# Altium footprint library PBL - THD Packages.PcbLib: 256 footprints (part 14 of 16)
Each footprint in its own frame and in the unit in brackets; x right, y up, seen from the top. Pads: shape width x height; smd on the part's side, far side on the other; paste and mask are expansions set on the pad; w line width, h text height; cw(c..) or ccw(c..) is an arc to the next point about the centre after c.
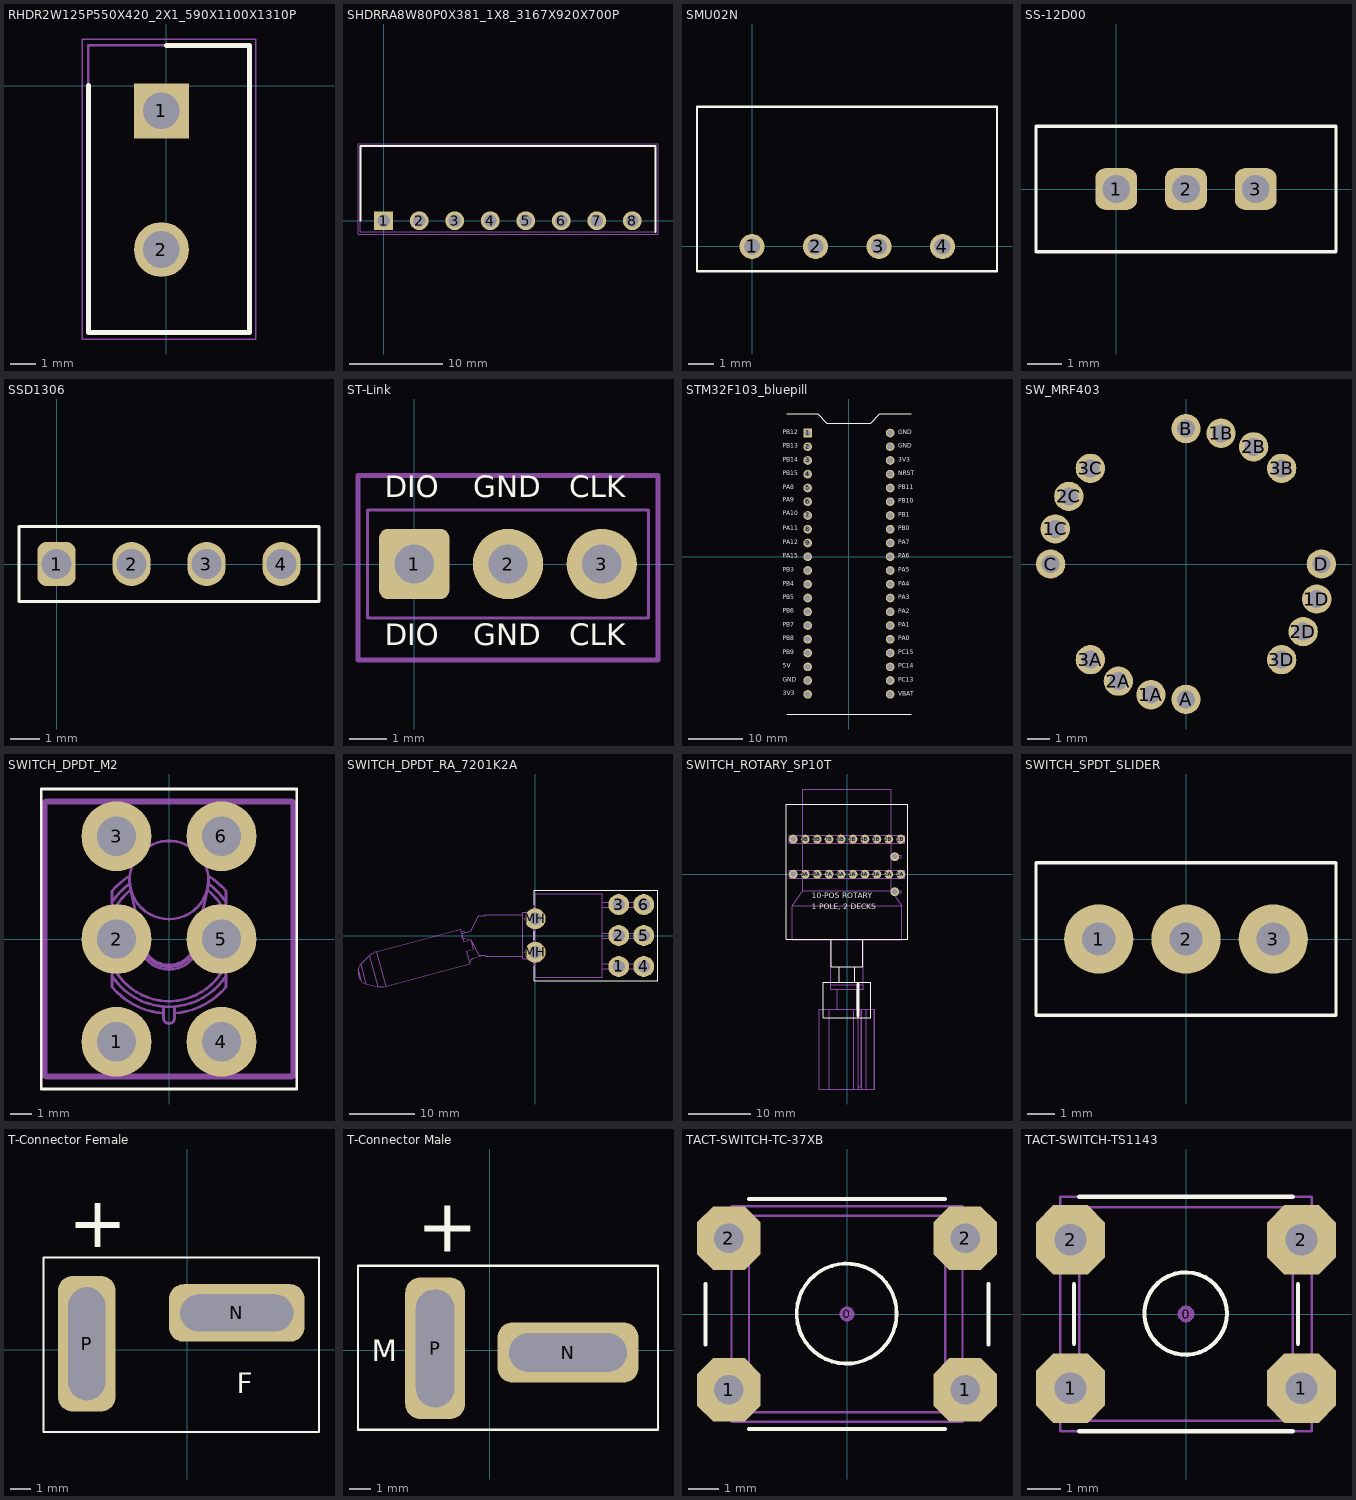
[diagram p13: the footprints below, top view; thin cyan lines are the x and y axes]

## RHDR2W125P550X420_2X1_590X1100X1310P [mm]
pads (2):
  rect 2.175x2.175 hole 1.45: 1(-0.2,-1)
  round 2.175 hole 1.45: 2(-0.2,-6.5)
Top Overlay:
  lines w0.2: -3.1,0 -3.1,-9.8 3.3,-9.8 3.3,1.6 0,1.6
13 - 3D Top Side:
  lines w0.1: -3.1,-9.8 3.3,-9.8 3.3,1.6 -3.1,1.6 -3.1,-9.8
15 - Top Courtyards:
  lines w0.05: -3.35,-10.05 3.55,-10.05 3.55,1.85 -3.35,1.85 -3.35,-10.05
3D body "39-28-1023.stp": height 12.8, standoff -3.5, extent -3.3,-9.8 2.9,1.2

## SHDRRA8W80P0X381_1X8_3167X920X700P [mm]
pads (8):
  rect 2.025x2.025 hole 1.35: 1(0,0)
  round 2.025 hole 1.35: 2(3.81,0) 3(7.62,0) 4(11.43,0) 5(15.24,0) 6(19.05,0) 7(22.86,0) 8(26.67,0)
Top Overlay:
  lines w0.2: -2.5,0 -2.5,8 29.17,8 29.17,-1.2
13 - 3D Top Side:
  lines w0.1: -2.5,-1.2 -2.5,8 29.17,8 29.17,-1.2 -2.5,-1.2
15 - Top Courtyards:
  lines w0.05: -2.75,-1.45 29.42,-1.45 29.42,8.25 -2.75,8.25 -2.75,-1.45
3D body "70054546.stp": height 7.35, standoff -3.3, extent -2.585,-1.25 29.285,8.05

## SMU02N [mm] "SMU02N series footprint"
pads (4):
  round 1 hole 0.65: 1(0,0) 2(2.54,0) 3(5.08,0) 4(7.62,0)
Top Overlay:
  lines w0.1: -2.2,-1 -2.2,5.6 9.8,5.6 9.8,-1 -2.2,-1

## SS-12D00 [mm]
pads (3):
  rrect50% 1.2x1.2 hole 0.8: 1(0,0) 2(2,0) 3(4,0)
Top Overlay:
  lines w0.1: -2.3,-1.8 6.3,-1.8 6.3,1.8 -2.3,1.8 -2.3,-1.8

## SSD1306 [mm] "OLED display"
pads (4):
  rrect50% 1.3x1.5 hole 1 mask+0.05: 1(0,0)
  oval 1.3x1.5 hole 1 mask+0.05: 2(2.54,0) 3(5.08,0) 4(7.62,0)
Top Overlay:
  lines w0.1: -1.27,-1.27 8.89,-1.27 8.89,1.27 -1.27,1.27 -1.27,-1.27
3D body "OLED.STEP": height 15.76, standoff -14.06, extent -15.864,-3.496 22.692,33.679

## ST-Link [mil] "Connector; Header; 3 Position"
pads (3):
  rrect25% 75x75 hole 42: 1(0,0)
  round 75 hole 42: 2(100,0) 3(200,0)
Top Overlay:
  text "CLK" at 165.35,62.99 h39.37
  text "DIO" at -31.5,62.99 h39.37
  text "GND" at 62.99,62.99 h39.37
  text "GND" at 62.99,-94.49 h39.37
  text "DIO" at -31.5,-94.49 h39.37
  text "CLK" at 165.35,-94.49 h39.37
13 - 3D Top Side:
  lines w3: -50,-57.47 250,-57.47 250,57.49 -50,57.49 -50,-57.47
15 - Top Courtyards:
  lines w5: -60,-102.36 260,-102.36 260,94.49 -60,94.49 -60,-102.36
3D body "PinHeaderX3.stp": height 335.04, standoff -144.88, extent -50,-57.47 250,57.49

## STM32F103_bluepill [mm]
pads (40):
  rect 1.6x1.6 hole 1.1: 1(-7.62,22.86)
  round 1.6 hole 1.1: 2(-7.62,20.32) 3(-7.62,17.78) 4(-7.62,15.24) 5(-7.62,12.7) 6(-7.62,10.16) 7(-7.62,7.62) 8(-7.62,5.08) 9(-7.62,2.54) 10(-7.62,0) 11(-7.62,-2.54) 12(-7.62,-5.08) 13(-7.62,-7.62) 14(-7.62,-10.16) 15(-7.62,-12.7) 16(-7.62,-15.24) 17(-7.62,-17.78) 18(-7.62,-20.32) 19(-7.62,-22.86) 20(-7.62,-25.4) 21(7.62,-25.4) 22(7.62,-22.86) 23(7.62,-20.32) 24(7.62,-17.78) 25(7.62,-15.24) 26(7.62,-12.7) 27(7.62,-10.16) 28(7.62,-7.62) 29(7.62,-5.08) 30(7.62,-2.54) 31(7.62,0) 32(7.62,2.54) 33(7.62,5.08) 34(7.62,7.62) 35(7.62,10.16) 36(7.62,12.7) 37(7.62,15.24) 38(7.62,17.78) 39(7.62,20.32) 40(7.62,22.86)
Top Overlay:
  lines w0.2: -11.52,-29.04 11.48,-29.04 ; -11.52,26.36 -5.77,26.36 -4.07,24.66 4.03,24.66 5.73,26.36 11.48,26.36
  text "PC15" at 9.144,-18.257 h1.4
  text "PC14" at 9.144,-20.797 h1.4
  text "PC13" at 9.145,-23.352 h1.4
  text "VBAT" at 9.145,-25.908 h1.4
  text "3V3" at -12.192,-25.892 h1.4
  text "GND" at -12.192,-23.352 h1.4
  text "5V" at -12.192,-20.812 h1.4
  text "PB9" at -12.192,-18.272 h1.4
  text "PB8" at -12.192,-15.732 h1.4
  text "PB7" at -12.192,-13.208 h1.4
  text "PB6" at -12.192,-10.652 h1.4
  text "PB5" at -12.192,-8.112 h1.4
  text "PB4" at -12.192,-5.588 h1.4
  text "PB3" at -12.192,-3.032 h1.4
  text "PA15" at -12.192,-0.492 h1.4
  text "PA12" at -12.192,2.032 h1.4
  text "PA11" at -12.192,4.572 h1.4
  text "PA10" at -12.192,7.382 h1.4
  text "PA9" at -12.192,9.922 h1.4
  text "PA8" at -12.192,12.208 h1.4
  text "PB15" at -12.192,14.748 h1.4
  text "PB14" at -12.192,17.272 h1.4
  text "PB13" at -12.192,19.828 h1.4
  text "PB12" at -12.192,22.352 h1.4
  text "PA0" at 9.145,-15.732 h1.4
  text "PA1" at 9.144,-13.208 h1.4
  text "PA2" at 9.144,-10.668 h1.4
  text "PA3" at 9.144,-8.112 h1.4
  text "PA4" at 9.144,-5.588 h1.4
  text "PA5" at 9.144,-3.032 h1.4
  text "PA6" at 9.144,-0.492 h1.4
  text "PA7" at 9.144,2.032 h1.4
  text "PB0" at 9.144,4.588 h1.4
  text "PB1" at 9.144,7.112 h1.4
  text "PB10" at 9.144,9.668 h1.4
  text "PB11" at 9.144,12.192 h1.4
  text "NRST" at 9.144,14.748 h1.4
  text "3V3" at 9.144,17.288 h1.4
  text "GND" at 9.144,19.828 h1.4
  text "GND" at 9.144,22.368 h1.4
Bottom Overlay:
  text "PC15" at 12.192,-18.257 h1.4
  text "PC14" at 12.192,-20.797 h1.4
  text "PC13" at 12.191,-23.352 h1.4
  text "VBAT" at 12.191,-25.908 h1.4
  text "PA0" at 12.191,-15.732 h1.4
  text "PA1" at 12.192,-13.208 h1.4
  text "PA2" at 12.192,-10.668 h1.4
  text "PA3" at 12.192,-8.112 h1.4
  text "PA4" at 12.192,-5.588 h1.4
  text "PA5" at 12.192,-3.032 h1.4
  text "PA6" at 12.192,-0.492 h1.4
  text "PA7" at 12.192,2.032 h1.4
  text "PB0" at 12.192,4.588 h1.4
  text "PB1" at 12.192,7.112 h1.4
  text "PB10" at 12.192,9.668 h1.4
  text "PB11" at 12.192,12.192 h1.4
  text "NRST" at 12.192,14.748 h1.4
  text "3V3" at 12.192,17.288 h1.4
  text "GND" at 12.192,19.828 h1.4
  text "GND" at 12.192,22.368 h1.4
  text "3V3" at -9.906,-25.892 h1.4
  text "GND" at -9.906,-23.352 h1.4
  text "5V" at -9.906,-20.812 h1.4
  text "PB9" at -9.906,-18.272 h1.4
  text "PB8" at -9.906,-15.732 h1.4
  text "PB7" at -9.906,-13.208 h1.4
  text "PB6" at -9.906,-10.652 h1.4
  text "PB5" at -9.906,-8.112 h1.4
  text "PB4" at -9.906,-5.588 h1.4
  text "PB3" at -9.906,-3.032 h1.4
  text "PA15" at -9.906,-0.492 h1.4
  text "PA12" at -9.906,2.032 h1.4
  text "PA11" at -9.906,4.572 h1.4
  text "PA10" at -9.906,7.382 h1.4
  text "PA9" at -9.906,9.922 h1.4
  text "PA8" at -9.906,12.208 h1.4
  text "PB15" at -9.906,14.748 h1.4
  text "PB14" at -9.906,17.272 h1.4
  text "PB13" at -9.906,19.828 h1.4
  text "PB12" at -9.906,22.352 h1.4
3D body "stm32f103c8t6-board.STEP": height 11.6, standoff -5.4, extent -11.52,-31.44 11.48,26.36

## SW_MRF403 [mm]
height 8.2
pads (16):
  round 1.3 hole 0.8: 1A(-1.553,-5.796) 1B(1.553,5.796) 1C(-5.796,1.553) 1D(5.796,-1.553) 2A(-3,-5.196) 2B(3,5.196) 2C(-5.196,3) 2D(5.196,-3) 3A(-4.243,-4.243) 3B(4.243,4.243) 3C(-4.243,4.243) 3D(4.243,-4.243) A(0,-6) B(0,6) C(-6,0) D(6,0)
3D body "MRF403.STEP": height 8.2, standoff -3.51, extent -9.896,-9.896 9.896,9.896

## SWITCH_DPDT_M2 [mm] "NKK M2 Series DPDT Switch with 03 pin option"
height 28.448
pads (6):
  round 3.2 hole 1.8: 1(-2.4,-4.7) 2(-2.4,0) 3(-2.4,4.7) 4(2.4,-4.7) 5(2.4,0) 6(2.4,4.7)
Top Overlay:
  lines w0.127: -5.842,-6.858 5.842,-6.858 5.842,6.858 -5.842,6.858 -5.842,-6.858
13 - 3D Top Side:
  lines w0.127: -5.716,-6.313 -5.626,-6.223 ; -5.716,6.313 -5.626,6.223 ; -2.604,-1.681 ccw(c0,0) 2.604,-1.681 ; -2.604,-1.147 ccw(c0,0) 2.604,-1.147 ; -2.604,1.147 cw(c0,0) -1.752,2.241 ; -2.604,1.681 cw(c0,0) -1.801,2.522 ; -1.795,2.892 ccw(c0,0) -2.604,2.192 -2.604,-2.192 ccw(c0,0) -0.254,-3.394 ; -1.766,2.302 -1.191,-0.254 ccw(c0,0.033) 1.191,-0.254 1.766,2.302 ; -1.338,0.401 ccw(c0,0) 1.338,0.401 ; -1.267,0.085 ccw(c0,0) 1.267,0.085 ; -0.254,-3.088 -0.254,-3.607 ccw(c0,-3.607) 0.254,-3.607 0.254,-3.088 ; 0.254,-3.394 ccw(c0,0) 2.604,-2.192 2.604,2.192 ccw(c0,0) 1.795,2.892 ; 1.752,2.241 cw(c0,0) 2.604,1.147 ; 1.801,2.522 cw(c0,0) 2.604,1.681 ; 5.716,-6.313 5.626,-6.223 ; 5.716,6.313 5.626,6.223 ; -5.626,-6.223 -5.626,6.223 ; -5.626,-6.223 5.626,-6.223 ; -5.626,6.223 5.626,6.223 ; 5.626,-6.223 5.626,6.223 ; -5.753,-6.223 ccw(c-5.626,-6.223) -5.626,-6.35 5.626,-6.35 ccw(c5.626,-6.223) 5.753,-6.223 5.753,6.223 ccw(c5.626,6.223) 5.626,6.35 -5.626,6.35 ccw(c-5.626,6.223) -5.753,6.223 -5.753,-6.223 ; -1.808,2.679 ccw(c0,2.715) 1.808,2.679 ccw(c0,2.679) -1.808,2.679
3D body "Toggle Switch M2T2SG03.STEP": height 29.15, standoff -4.8, extent -5.753,-6.35 5.753,6.35

## SWITCH_DPDT_RA_7201K2A [mil] "DPDT Switch Right-angle PCB mount - C&K 7201K2A"
height 450
pads (8):
  round 125 hole 73: 1(500,-185) 2(500,0) 3(500,185) 4(650,-185) 5(650,0) 6(650,185) MH(0,-100) MH(0,100)
Top Overlay:
  lines w5: -5,-180 -5,-270 735,-270 735,270 -5,270 -5,180 ; -5,-25 -5,25
13 - 3D Top Side:
  lines w1.97: -445.94,27.92 -415.18,18.2 -384.21,26.59 ; -395.27,-159.34 -373.61,-135.45 -309.44,-118.08 ; -75,-125 -298.04,-125 -298.04,-118.08 -338.46,-118.08 -385,-25 ; -75,125 -298.04,125 -298.04,118.08 -338.46,118.08 -385,25 -435,12.5 -435,-12.5 -385,-25 ; -10,-145 0,-145 ; -10,-140 -75,-140 -75,140 -10,140 ; -10,145 0,145 ; 0,-170 -10,-170 -10,170 0,170 ; 400,-200 675,-200 675,-170 400,-170 ; 400,-15 675,-15 675,15 400,15 ; 400,170 675,170 675,200 400,200 ; 610,-200 610,-170 ; 610,-15 610,15 ; 610,170 610,200 ; -1060.2,-211.44 ccw(c-960.2,-211.71) -1046.43,-262.36 ; -1060.2,-211.44 -1046.43,-262.36 ; -1060.2,-211.44 -1060.19,-208.22 ; -1060.19,-208.22 cw(c-1010.19,-208.35) -1044.77,-172.23 ; -1060.19,-208.22 -1044.79,-265.13 ; -1046.43,-262.36 -1044.79,-265.13 ; -1044.79,-265.13 ccw(c-1001.68,-239.81) -1013.33,-288.43 ; -1044.77,-172.24 -1013.33,-288.43 ; -1044.77,-172.24 -992.57,-122.27 ; -1013.33,-288.43 -943.06,-305.26 ; -992.57,-122.27 cw(c-923.42,-194.5) -949.54,-97.97 ; -992.57,-122.27 -943.06,-305.26 ; -949.54,-97.97 -893.64,-304.55 ; -949.54,-97.97 -448.55,37.57 -428.44,-36.75 -385,-25 ; -943.06,-305.26 ccw(c-919.76,-208.02) -893.64,-304.55 ; -893.64,-304.55 -392.66,-169 -412.77,-94.67 -369.33,-82.92 -385,-25 ; 0,-250 0,250 400,250 400,-250 0,-250
3D body "Switch Toggle RA PCB CK 7201K2A.STEP": height 450, standoff -125, extent -1060.14,-308 675,250.01

## SWITCH_ROTARY_SP10T [mil] "Grayhill 71AF style 2-deck single pole 10-position rotary switch"
height 712.6
pads (22):
  round 56 hole 32: 1A(337.5,0) 1B(337.5,220) 2A(262.5,0) 2B(262.5,220) 3A(187.5,0) 3B(187.5,220) 4A(112.5,0) 4B(112.5,220) 5A(37.5,0) 5B(37.5,220) 6A(-37.5,0) 6B(-37.5,220) 7A(-112.5,0) 7B(-112.5,220) 8A(-187.5,0) 8B(-187.5,220) 9A(-262.5,0) 9B(-262.5,220) 10A(-337.5,0) 10B(-337.5,220) C1A(300,-110) C1B(300,110)
Top Overlay:
  lines w5: -100,-410 -100,-580 100,-580 100,-410 ; -50,-580 -50,-680 50,-680 50,-580 ; -380,-410 380,-410 380,440 -380,440 -380,-410 ; -150,-900 150,-900 150,-680 -150,-680 -150,-900
  lines w20: 70,-890 70,-690
  text "10-POS ROTARY" at -220,-150 h35
  text "1 POLE, 2 DECKS" at -220,-220 h35
13 - 3D Top Side:
  lines w5: -343.5,-25 -343.5,25 ; -343.5,195 -343.5,245 ; -278.5,-25 -278.5,-104.17 ; -278.5,25 -278.5,195 ; -278.5,245 -278.5,535 278.5,535 278.5,245 ; -112.06,-1349 -112.06,-849 ; -101.5,-694 101.5,-694 ; -101.5,-412 -101.5,-724 101.5,-724 101.5,-412 ; -62.5,-849 -62.5,-724 ; 43.85,-1349 43.85,-849 ; 62.5,-849 62.5,-724 ; 70,-1349 70,-849 ; 70,-1334 89.14,-1334 89.14,-849 ; 93.78,-1349 93.78,-849 ; 119.93,-1349 119.93,-849 ; 169.67,-1349 169.67,-849 ; 278.5,-102.5 278.5,-25 ; 278.5,25 278.5,102.5 ; 278.5,117.5 278.5,195 ; 287.83,-117.5 343.5,-197 ; 343.5,-25 343.5,25 ; 343.5,195 343.5,245 ; -343.5,-197 343.5,-197 ; -343.5,-197 -278.5,-104.17 ; -343.5,-197 -343.5,-412 343.5,-412 343.5,-197 ; -278.5,-104.17 275.61,-104.17 ; 275.61,-104.17 275.61,-102.5 340,-102.5 340,-117.5 285.04,-117.5 275.61,-104.17 ; -362.5,-25 -362.5,25 362.5,25 362.5,-25 -362.5,-25 ; -362.5,195 -362.5,245 362.5,245 362.5,195 -362.5,195 ; -175,-1349 175,-1349 175,-849 -175,-849 -175,-1349 ; 275.61,102.5 340,102.5 340,117.5 275.61,117.5 275.61,102.5
3D body "Rotary Switch Grayhill 71ADF36-02PAJN.STEP": height 711.5, standoff -156, extent -362.49,-1348.99 362.51,535

## SWITCH_SPDT_SLIDER [mil] "TE Connectivity SLS121PC04 SPDT slider"
height 396
pads (3):
  round 100 hole 48: 1(-126,0) 2(0,0) 3(126,0)
Top Overlay:
  lines w5: -216.54,-110.24 -216.54,110.24 216.54,110.24 216.54,-110.24 -216.54,-110.24
3D body "Slide Switch SLS121PC04.STEP": height 394, standoff -170, extent -216.49,-109.99 216.51,110.01

## T-Connector Female [mm]
pads (2):
  rrect50% 6.6x2.8 hole 1.8 slot 5.5 at 0 deg: N(2.4,1.8)
  rrect50% 2.8x6.6 hole 1.8 slot 5.5 at 90 deg: P(-4.9,0.3)
Top Overlay:
  lines w0.1: -7,-4 -7,4.5 6.4,4.5 6.4,-4 -7,-4
  text "+" at -5.8,5 h2.5
  text "F" at 2.4,-2.1 h1

## T-Connector Male [mm]
pads (2):
  rrect50% 6.6x2.8 hole 1.8 slot 5.5 at 0 deg: N(3.65,-0.1)
  rrect50% 2.8x6.6 hole 1.8 slot 5.5 at 90 deg: P(-2.55,0.1)
Top Overlay:
  lines w0.1: 0.35,3.95 -1.15,3.95 ; -1.15,3.95 -1.15,3.95 ; -6.15,-3.7 7.85,-3.7 7.85,3.95 -6.15,3.95 -6.15,-3.7
  text "+" at -3.4,4.6 h2.5
  text "M" at -5.5,-0.5 h1

## TACT-SWITCH-TC-37XB [mm] "Wealth Metal sealed TH tact switch"
height 5
pads (5):
  round 0.508 on Mech15: 0(0,0)
  oct 2.1x2.1 hole 0.965: 1(-3.9,-2.5) 1(3.9,-2.5) 2(-3.9,2.5) 2(3.9,2.5)
Top Overlay:
  circle w0.127: c-0.011,0.014 r1.65
  lines w0.127: -4.67,-1 -4.67,1 ; -3.239,-3.791 3.24,-3.791 ; -3.232,3.794 3.24,3.794 ; 4.67,-1 4.67,1
13 - 3D Top Side:
  circle w0.076: c-0.011,0.014 r1.65
  lines w0.076: -3.232,-3.237 -3.232,3.24 3.24,3.24 3.24,-3.237 -3.232,-3.237
15 - Top Courtyards:
  lines w0.076: -3.81,-3.556 3.81,-3.556 3.81,3.556 -3.81,3.556 -3.81,-3.556
3D body "TC-37XB.stp": height 5, standoff -3.9, extent -4.456,-3.6 4.456,3.6

## TACT-SWITCH-TS1143 [mm] "Bondtact sealed TH tact switch"
height 4.318
pads (5):
  round 0.508 on Mech15: 0(0,0)
  oct 2.1x2.1 hole 0.965: 1(-3.5,-2.25) 1(3.5,-2.25) 2(-3.5,2.25) 2(3.5,2.25)
Top Overlay:
  circle w0.127: c-0.011,0.014 r1.25
  lines w0.127: -3.4,-0.9 -3.4,0.9 ; -3.239,-3.556 3.24,-3.556 ; -3.236,3.556 3.236,3.556 ; 3.4,-0.9 3.4,0.9
13 - 3D Top Side:
  circle w0.076: c-0.011,0.014 r1.25
  lines w0.076: -3.232,-3.237 3.24,-3.237 3.24,3.24 -3.232,3.24 -3.232,-3.237
15 - Top Courtyards:
  lines w0.076: -3.81,-3.556 -3.81,3.556 3.81,3.556 3.81,-3.556 -3.81,-3.556
3D body "TS-1143-WP.stp": height 4.3, standoff -3.5, extent -4.134,-3.25 4.134,3.25